# Altium footprint library Footrprints.PcbLib: 32 footprints (part 1 of 2)
Each footprint in its own frame and in the unit in brackets; x right, y up, seen from the top. Pads: shape width x height; smd on the part's side, far side on the other; paste and mask are expansions set on the pad; w line width, h text height; cw(c..) or ccw(c..) is an arc to the next point about the centre after c.
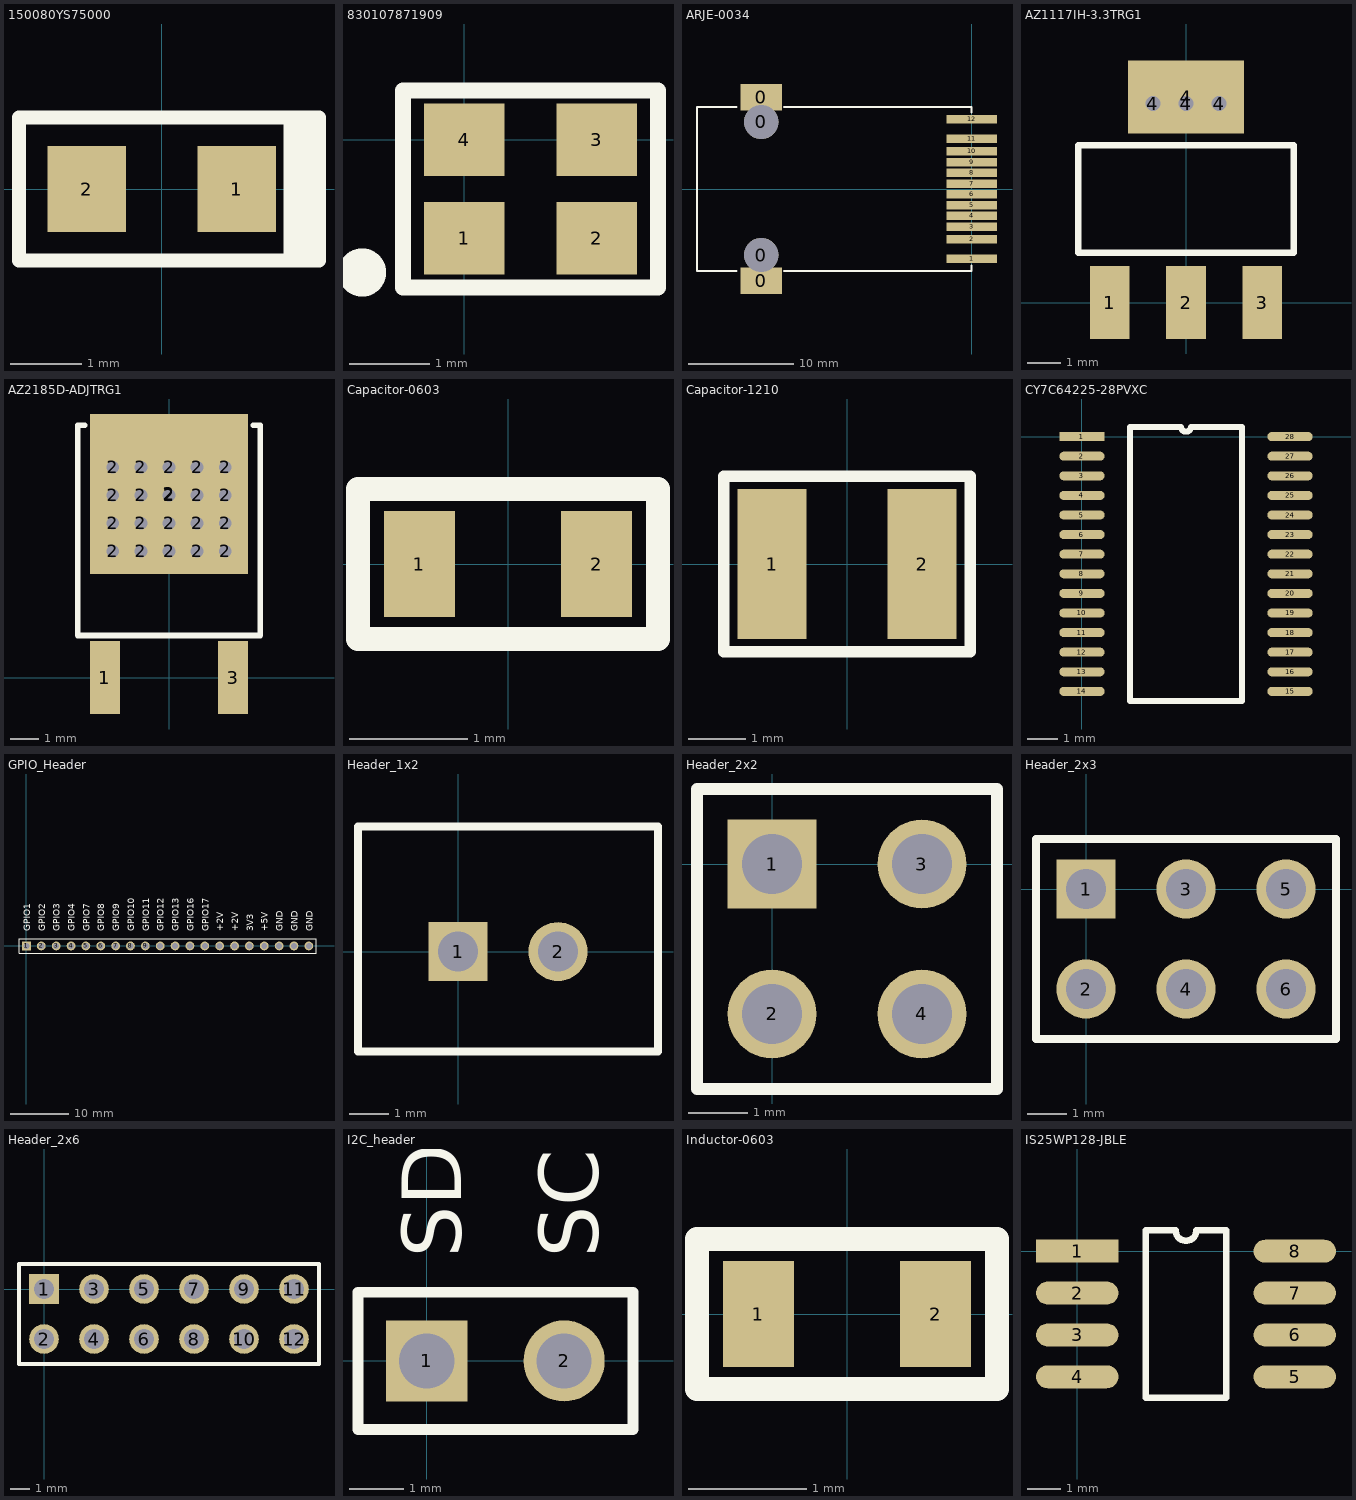
[diagram p0: the footprints below, top view; thin cyan lines are the x and y axes]

## 150080YS75000 [mm]
pads (2):
  rect 1.1x1.2 smd: 1(1.05,0) 2(-1.05,0)
Top Overlay:
  lines w0.2: 1.8,-1 1.8,1 ; 2,-1 2.2,-1 2.2,1 2,1 ; 2,-1 2,1 ; 2,-1 -2,-1 -2,0 -2,1 2,1

## 830107871909 [mm]
pads (4):
  rect 1x0.9 smd: 1(0,-1.225) 2(1.65,-1.225) 3(1.65,0) 4(0,0)
Top Overlay:
  circle w0.5: c-1.27,-1.651 r0.05
  lines w0.2: 0.519,0.612 2.413,0.612 2.413,-1.837 -0.762,-1.837 -0.762,0.612 1.131,0.612

## ARJE-0034 [mm]
pads (16):
  rect 3.9x2.5 smd: 0(-19.92,-8.67) 0(-19.92,8.67)
  round 3.25 / inner round 0.5 / far side round 3.25 hole 3.25: 0(-19.92,-6.25) 0(-19.92,6.35)
  rect 4.8x0.81 smd: 1(0,-6.61) 2(0,-4.77) 3(0,-3.57) 4(0,-2.55) 5(0,-1.53) 6(0,-0.51) 7(0,0.51) 8(0,1.53) 9(0,2.55) 10(0,3.57) 11(0,4.77) 12(0,6.61)
Top Overlay:
  lines w0.2: -22.25,-7.75 -26,-7.75 -26,7.75 -22.25,7.75 ; -17.75,-7.75 0,-7.75 0,-7.25 ; -17.75,7.75 0,7.75 0,7.25
3D body "ARJE-0034.STEP": height 16.75, standoff -0.33, extent -25.281,-10.405 2,10.25

## AZ1117IH-3.3TRG1 [mm]
pads (7):
  rect 1.2x2.2 smd: 1(-2.3,0) 2(0,0) 3(2.3,0)
  round 0.8 hole 0.45: 4(-1,6) 4(0,6) 4(1,6)
  rect 3.5x2.2 smd: 4(0,6.2)
Top Overlay:
  lines w0.2: -3.25,1.5 -3.25,4.75 -3,4.75 1,4.75 3.25,4.75 3.25,1.5 -3,1.5 -3.25,1.5
3D body "sot223_p2-3_l6-7_w3-7.stp": height 1.7, standoff -0.1, extent -3.299,-0.659 3.401,6.641

## AZ2185D-ADJTRG1 [mm]
pads (23):
  rect 1.06x2.6 smd: 1(-2.286,0) 3(2.286,0)
  round 0.8 hole 0.45: 2(-2,4.5) 2(-2,5.5) 2(-2,6.5) 2(-2,7.5) 2(-1,4.5) 2(-1,5.5) 2(-1,6.5) 2(-1,7.5) 2(0,4.5) 2(0,5.5) 2(0,6.5) 2(0,7.5) 2(1,4.5) 2(1,5.5) 2(1,6.5) 2(1,7.5) 2(2,4.5) 2(2,5.5) 2(2,6.5) 2(2,7.5)
  rect 5.632x5.7 smd: 2(0,6.55)
Top Overlay:
  lines w0.2: -3,9 -3.25,9 -3.25,1.5 3.25,1.5 3.25,9 3,9
3D body "to252-3_p4-56_l6-54_w6-04.stp": height 2.29, standoff -0.01, extent -3.27,-0.77 3.27,8.898

## Capacitor-0603 [mm]
pads (2):
  rect 0.6x0.9 smd: 1(-0.75,0) 2(0.75,0)
Top Overlay:
  lines w0.2: -1.27,-0.635 -1.27,0.635 1.27,0.635 1.27,-0.635 -1.27,-0.635
3D body "Ceramic_Capacitor_0603_h32mil.step": height 0.81, standoff 0.01, extent -0.8,-0.4 0.8,0.4

## Capacitor-1210 [mm]
pads (2):
  rect 1.2x2.6 smd: 1(-1.3,0) 2(1.3,0)
Top Overlay:
  lines w0.2: -2.134,-1.524 -2.134,0.534 -2.134,1.524 2.134,1.524 2.134,-1.524 -2.134,-1.524
3D body "Ceramic_Capacitor_1210_h63mil.step": height 1.61, standoff 0.01, extent -1.6,-1.25 1.6,1.25

## CY7C64225-28PVXC [mm]
pads (28):
  rect 1.5x0.3 smd: 1(0,0)
  oval 1.5x0.3 smd: 2(0,-0.65) 3(0,-1.3) 4(0,-1.95) 5(0,-2.6) 6(0,-3.25) 7(0,-3.9) 8(0,-4.55) 9(0,-5.2) 10(0,-5.85) 11(0,-6.5) 12(0,-7.15) 13(0,-7.8) 14(0,-8.45) 15(6.9,-8.45) 16(6.9,-7.8) 17(6.9,-7.15) 18(6.9,-6.5) 19(6.9,-5.85) 20(6.9,-5.2) 21(6.9,-4.55) 22(6.9,-3.9) 23(6.9,-3.25) 24(6.9,-2.6) 25(6.9,-1.95) 26(6.9,-1.3) 27(6.9,-0.65) 28(6.9,0)
Top Overlay:
  lines w0.2: 1.585,-8.775 5.315,-8.775 5.315,0.325 3.612,0.325 cw(c3.45,0.325) 3.287,0.325 1.585,0.325 1.585,-8.775
3D body "SSOP-28.step": height 2.15, standoff 0, extent -0.423,-9.398 7.332,0.932

## GPIO_Header [mm]
pads (20):
  rect 1.5x1.5 / inner round 1.5 / far side rect 1.5x1.5 hole 1.02: 1(0,0)
  round 1.5 hole 1.02: 2(2.54,0) 3(5.08,0) 4(7.62,0) 5(10.16,0) 6(12.7,0) 7(15.24,0) 8(17.78,0) 9(20.32,0) 10(22.86,0) 11(25.4,0) 12(27.94,0) 13(30.48,0) 14(33.02,0) 15(35.56,0) 16(38.1,0) 17(40.64,0) 18(43.18,0) 19(45.72,0) 20(48.26,0)
Top Overlay:
  lines w0.2: -1.27,-1.27 49.53,-1.27 49.53,1.27 -1.27,1.27 -1.27,-1.27
  text "GPIO1" at 0.635,2.54 h1.1
  text "GPIO2" at 3.175,2.54 h1.1
  text "GPIO3" at 5.715,2.54 h1.1
  text "GPIO4" at 8.255,2.54 h1.1
  text "GPIO7" at 10.795,2.54 h1.1
  text "GPIO8" at 13.335,2.54 h1.1
  text "GPIO9" at 15.875,2.54 h1.1
  text "GPIO10" at 18.415,2.54 h1.1
  text "GPIO11" at 20.955,2.54 h1.1
  text "GPIO12" at 23.495,2.54 h1.1
  text "GPIO13" at 26.035,2.54 h1.1
  text "GPIO16" at 28.575,2.54 h1.1
  text "GPIO17" at 31.115,2.54 h1.1
  text "+2V" at 33.655,2.54 h1.1
  text "+2V" at 36.195,2.54 h1.1
  text "3V3" at 38.735,2.54 h1.1
  text "+5V" at 41.275,2.54 h1.1
  text "GND" at 43.815,2.54 h1.1
  text "GND" at 46.355,2.54 h1.1
  text "GND" at 48.895,2.54 h1.1
3D body "1x10.STEP": height 9, standoff -8.64, extent -1.27,-1.295 24.13,1.245
3D body "1x10.STEP": height 9, standoff -8.64, extent 24.13,-1.295 49.53,1.245

## Header_1x2 [mm]
pads (2):
  rect 1.5x1.5 / inner round 1.5 / far side rect 1.5x1.5 hole 1.02: 1(0,0)
  round 1.5 hole 1.02: 2(2.54,0)
Top Overlay:
  lines w0.2: -2.54,-2.54 5.08,-2.54 5.08,3.18 -2.54,3.18 -2.54,-2.54
3D body "c-640454-2-aa-3d.stp": height 10.49, standoff -3.1, extent -1.27,-2.54 3.81,3.18

## Header_2x2 [mm]
pads (4):
  rect 1.5x1.5 / inner round 1.5 / far side rect 1.5x1.5 hole 1.02: 1(0,0)
  round 1.5 hole 1.02: 2(0,-2.54) 3(2.54,0) 4(2.54,-2.54)
Top Overlay:
  lines w0.2: -1.27,-3.81 3.81,-3.81 3.81,1.27 -1.27,1.27 -1.27,-3.81
3D body "Pin Header 2x2 TH Pitch 2.54mm.stp": height 9.5, standoff -3.2, extent -1.219,-3.886 3.861,1.194

## Header_2x3 [mm]
pads (6):
  rect 1.5x1.5 / inner round 1.5 / far side rect 1.5x1.5 hole 1.02: 1(0,0)
  round 1.5 hole 1.02: 2(0,-2.54) 3(2.54,0) 4(2.54,-2.54) 5(5.08,0) 6(5.08,-2.54)
Top Overlay:
  lines w0.2: -1.27,-3.81 6.35,-3.81 6.35,1.27 -1.27,1.27 -1.27,-3.81

## Header_2x6 [mm]
pads (12):
  rect 1.5x1.5 / inner round 1.5 / far side rect 1.5x1.5 hole 1.02: 1(0,0)
  round 1.5 hole 1.02: 2(0,-2.54) 3(2.54,0) 4(2.54,-2.54) 5(5.08,0) 6(5.08,-2.54) 7(7.62,0) 8(7.62,-2.54) 9(10.16,0) 10(10.16,-2.54) 11(12.7,0) 12(12.7,-2.54)
Top Overlay:
  lines w0.2: -1.27,-3.81 13.97,-3.81 13.97,1.27 -1.27,1.27 -1.27,-3.81
3D body "Pin Header 2x6 TH Pitch 2.54mm.stp": height 9.5, standoff -3.2, extent -1.422,-3.911 13.818,1.169

## I2C_header [mm]
pads (2):
  rect 1.5x1.5 / inner round 1.5 / far side rect 1.5x1.5 hole 1.02: 1(0,0)
  round 1.5 hole 1.02: 2(2.54,0)
Top Overlay:
  lines w0.2: -1.27,-1.27 3.81,-1.27 3.81,1.27 -1.27,1.27 -1.27,-1.27
  text "SCL" at 3.175,1.905 h1.1
  text "SDA" at 0.635,1.905 h1.1
3D body "1x2.STEP": height 9, standoff -8.64, extent -1.334,-1.244 3.746,1.296

## Inductor-0603 [mm]
pads (2):
  rect 0.6x0.9 smd: 1(-0.75,0) 2(0.75,0)
Top Overlay:
  lines w0.2: -1.27,-0.635 1.27,-0.635 1.27,0.635 -1.27,0.635 -1.27,-0.635
3D body "Ceramic_Capacitor_0603_h32mil.step": height 0.81, standoff 0.01, extent -0.8,-0.4 0.8,0.4

## IS25WP128-JBLE [mm]
height 2.16
pads (8):
  rect 2.5x0.7 smd: 1(0,0)
  oval 2.5x0.7 smd: 2(0,-1.27) 3(0,-2.54) 4(0,-3.81) 5(6.6,-3.81) 6(6.6,-2.54) 7(6.6,-1.27) 8(6.6,0)
Top Overlay:
  lines w0.2: 2.085,-4.445 4.515,-4.445 4.515,0.635 3.617,0.635 cw(c3.3,0.635) 2.982,0.635 2.085,0.635 2.085,-4.445
3D body "IS25WP128-JBLE.stp": height 2.16, standoff 0, extent -0.64,-4.55 7.26,0.73